# Altium footprint library SOCKET_DIP.PCBLIB: 19 footprints (part 2 of 2)
Each footprint in its own frame and in the unit in brackets; x right, y up, seen from the top. Pads: shape width x height; smd on the part's side, far side on the other; paste and mask are expansions set on the pad; w line width, h text height; cw(c..) or ccw(c..) is an arc to the next point about the centre after c.
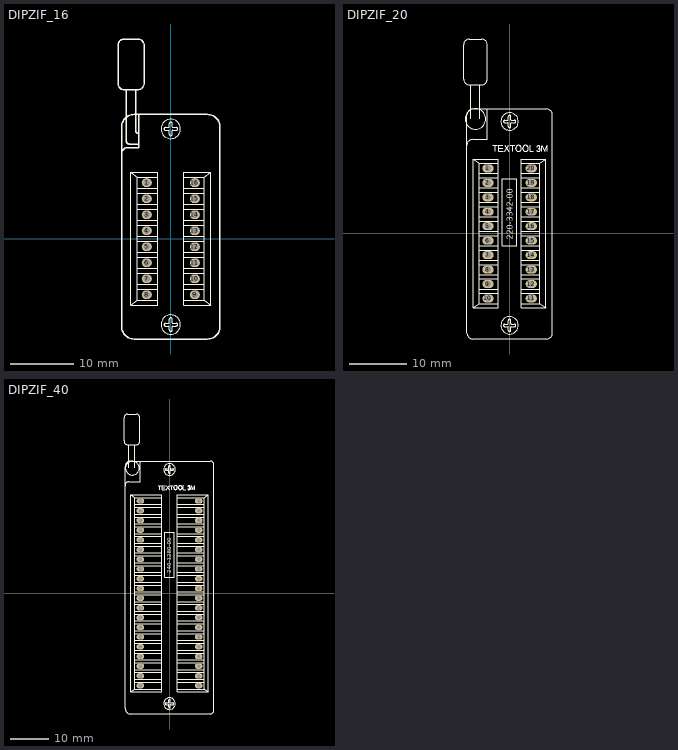
[diagram p1: the footprints below, top view; thin cyan lines are the x and y axes]

## DIPZIF_16 [mm] "SOCKET ZIF DIP, pitch 2.54mm, 300mil Width"
pads (16):
  oval 1.6x1.4 / inner round 1.4 / far side oval 2.2x1.4 hole 1: 1(-3.81,8.89) 2(-3.81,6.35) 3(-3.81,3.81) 4(-3.81,1.27) 5(-3.81,-1.27) 6(-3.81,-3.81) 7(-3.81,-6.35) 8(-3.81,-8.89) 9(3.81,-8.89) 10(3.81,-6.35) 11(3.81,-3.81) 12(3.81,-1.27) 13(3.81,1.27) 14(3.81,3.81) 15(3.81,6.35) 16(3.81,8.89)
TopOverlay:
  circle w0.102: c0,17.41 r1.53
  circle w0.102: c0,-13.61 r1.53
  lines w0.102: -5.334,-8.001 -2.032,-8.001 ; -5.334,-7.239 -2.032,-7.239 ; -5.334,-5.461 -2.032,-5.461 ; -5.334,-4.699 -2.032,-4.699 ; -5.334,-2.921 -2.032,-2.921 ; -5.334,-2.159 -2.032,-2.159 ; -5.334,-0.381 -2.032,-0.381 ; -5.334,0.381 -2.032,0.381 ; -5.334,2.159 -2.032,2.159 ; -5.334,2.921 -2.032,2.921 ; -5.334,4.699 -2.032,4.699 ; -5.334,5.461 -2.032,5.461 ; -5.334,7.239 -2.032,7.239 ; -5.334,8.001 -2.032,8.001 ; -2.032,-9.779 -5.334,-9.779 ; -2.032,9.779 -5.334,9.779 ; -0.85,17.18 cw(c-0.85,17.41) -1.08,17.41 cw(c-0.85,17.41) -0.85,17.64 -0.31,17.64 ; -0.85,17.18 -0.3,17.18 ; -0.31,-13.84 -0.85,-13.84 cw(c-0.85,-13.61) -1.08,-13.61 cw(c-0.85,-13.61) -0.85,-13.38 -0.3,-13.38 ; -0.3,-13.84 cw(c-0.3,-13.91) -0.23,-13.91 -0.23,-14.46 ccw(c0,-14.46) 0,-14.69 ccw(c0,-14.46) 0.23,-14.46 0.23,-13.92 ; -0.3,-13.37 ccw(c-0.3,-13.3) -0.23,-13.3 -0.23,-12.76 cw(c0,-12.76) 0,-12.53 cw(c0,-12.76) 0.23,-12.76 0.23,-13.31 ccw(c0.3,-13.31) 0.3,-13.38 ; -0.3,17.17 cw(c-0.3,17.1) -0.23,17.1 -0.23,16.56 ccw(c0,16.56) 0,16.33 ccw(c0,16.56) 0.23,16.56 0.23,17.11 cw(c0.3,17.11) 0.3,17.18 ; -0.3,17.64 ccw(c-0.3,17.71) -0.23,17.71 -0.23,18.26 cw(c0,18.26) 0,18.49 cw(c0,18.26) 0.23,18.26 0.23,17.72 ; 0.23,-13.91 cw(c0.3,-13.91) 0.3,-13.84 ; 0.23,17.71 ccw(c0.3,17.71) 0.3,17.64 0.85,17.64 cw(c0.85,17.41) 1.08,17.41 cw(c0.85,17.41) 0.85,17.18 ; 0.3,-13.84 0.85,-13.84 ccw(c0.85,-13.61) 1.08,-13.61 ccw(c0.85,-13.61) 0.85,-13.38 0.31,-13.38 ; 0.31,17.18 0.85,17.18 ; 2.032,-9.779 5.334,-9.779 ; 2.032,-8.001 5.334,-8.001 ; 2.032,-7.239 5.334,-7.239 ; 2.032,-5.461 5.334,-5.461 ; 2.032,-4.699 5.334,-4.699 ; 2.032,-2.921 5.334,-2.921 ; 2.032,-2.159 5.334,-2.159 ; 2.032,-0.381 5.334,-0.381 ; 2.032,0.381 5.334,0.381 ; 2.032,2.159 5.334,2.159 ; 2.032,2.921 5.334,2.921 ; 2.032,4.699 5.334,4.699 ; 2.032,5.461 5.334,5.461 ; 2.032,7.239 5.334,7.239 ; 2.032,8.001 5.334,8.001 ; 2.032,9.779 5.334,9.779 ; -6.35,-10.541 -5.334,-9.779 ; -6.35,-10.541 -2.032,-10.541 -2.032,10.541 -6.35,10.541 ; -6.35,-10.541 -6.35,10.541 ; -6.35,10.541 -5.334,9.779 ; -5.334,-9.779 -5.334,9.779 ; 5.334,-9.779 5.334,9.779 ; 5.334,-9.779 6.35,-10.541 ; 5.334,9.779 6.35,10.541 ; 6.35,-10.541 6.35,10.541 ; 6.35,-10.541 2.032,-10.541 2.032,10.541 6.35,10.541
  lines w0.2: -7.8,13.4 cw(c-6.8,13.449) -6.8,14.45 -5.1,14.45 -5.1,19.7 ; -7.1,23.57 -7.1,15.6 ccw(c-6.5,15.6) -6.5,15 -5.1,15 ; -5.55,23.57 -5.55,17.1 ccw(c-5.15,17.1) -5.15,16.7 ; -8.37,24.62 ccw(c-7.37,24.62) -7.37,23.62 -5.23,23.62 ccw(c-5.23,24.62) -4.23,24.62 -4.23,30.67 ccw(c-5.23,30.67) -5.23,31.67 -7.37,31.67 ccw(c-7.37,30.67) -8.37,30.67 -8.37,24.62 ; -7.8,-13.9 ccw(c-5.8,-13.9) -5.8,-15.9 5.8,-15.9 ccw(c5.8,-13.9) 7.8,-13.9 7.8,17.7 ccw(c5.8,17.7) 5.8,19.7 -5.8,19.7 ccw(c-5.8,17.7) -7.8,17.7 -7.8,-13.9
3D body "User Library-16 pin IC ZIF Socket closed.STEP": height 12.1, standoff -3, extent -8.4,-15.828 7.65,32.035

## DIPZIF_20 [mm] "SOCKET ZIF DIP 20"
pads (20):
  oval 2x1.4 hole 1: 1(-3.81,11.43) 2(-3.81,8.89) 3(-3.81,6.35) 4(-3.81,3.81) 5(-3.81,1.27) 6(-3.81,-1.27) 7(-3.81,-3.81) 8(-3.81,-6.35) 9(-3.81,-8.89) 10(-3.81,-11.43) 11(3.81,-11.43) 12(3.81,-8.89) 13(3.81,-6.35) 14(3.81,-3.81) 15(3.81,-1.27) 16(3.81,1.27) 17(3.81,3.81) 18(3.81,6.35) 19(3.81,8.89) 20(3.81,11.43)
TopOverlay:
  drawing of 156 lines, arcs and shapes, not listed
  text "220-3342-00" at 0.508,-1.143 h1.02

## DIPZIF_40 [mm] "SOCKET ZIF DIP, pitch 2.54mm, 600mil Width, IC ZIF SOCKET, 240-6I82 3M"
pads (40):
  oval 2x1.4 hole 1: 1(-7.62,24.13) 2(-7.62,21.59) 3(-7.62,19.05) 4(-7.62,16.51) 5(-7.62,13.97) 6(-7.62,11.43) 7(-7.62,8.89) 8(-7.62,6.35) 9(-7.62,3.81) 10(-7.62,1.27) 11(-7.62,-1.27) 12(-7.62,-3.81) 13(-7.62,-6.35) 14(-7.62,-8.89) 15(-7.62,-11.43) 16(-7.62,-13.97) 17(-7.62,-16.51) 18(-7.62,-19.05) 19(-7.62,-21.59) 20(-7.62,-24.13) 21(7.62,-24.13) 22(7.62,-21.59) 23(7.62,-19.05) 24(7.62,-16.51) 25(7.62,-13.97) 26(7.62,-11.43) 27(7.62,-8.89) 28(7.62,-6.35) 29(7.62,-3.81) 30(7.62,-1.27) 31(7.62,1.27) 32(7.62,3.81) 33(7.62,6.35) 34(7.62,8.89) 35(7.62,11.43) 36(7.62,13.97) 37(7.62,16.51) 38(7.62,19.05) 39(7.62,21.59) 40(7.62,24.13)
TopOverlay:
  drawing of 196 lines, arcs and shapes, not listed
  text "240-1280-00" at 0.508,5.207 h1.02
3D body "Zif-Zip Socket.STEP": height 21.97, standoff -2.53, extent -12.975,-31.475 11.501,41.605